# Altium integrated library WE_WR-MPC3_Micro Power Connector_3.00 mm_rev15c.IntLib: 173 symbols (part 1 of 2) (continued)
## WE-3.00 mm Micro Power Connector 66201111022
designator C?
WR-MPC3 3.00 mm Male Single Row Angled Header; Manufacturer: Würth Elektronik eiSos GmbH; ComponentLink1 Description: Manufacturer; ComponentLink2 Description: Datasheet; NoPins: 11; Created Date: 28 August 2013; partNo: 66201111022; ComponentLink1URL: http://www.we-online.com; ComponentLink2URL: http://katalog.we-online.de/em/datasheet/6620xx11022.pdf; Created by: Karrer Zheng
footprint 66201111022 (Single row Right angle header With plastic peg 11p)
pins: 1, 2, 3, 4, 5, 6, 7, 8, 9, 10, 11

## WE-3.00 mm Micro Power Connector 66201211022
designator C?
WR-MPC3 3.00 mm Male Single Row Angled Header; Manufacturer: Würth Elektronik eiSos GmbH; ComponentLink1 Description: Manufacturer; ComponentLink2 Description: Datasheet; NoPins: 12; Created Date: 28 August 2013; partNo: 66201211022; ComponentLink1URL: http://www.we-online.com; ComponentLink2URL: http://katalog.we-online.de/em/datasheet/6620xx11022.pdf; Created by: Karrer Zheng
footprint 66201211022 (Single row Right angle header With plastic peg 12p)
pins: 1, 2, 3, 4, 5, 6, 7, 8, 9, 10, 11, 12


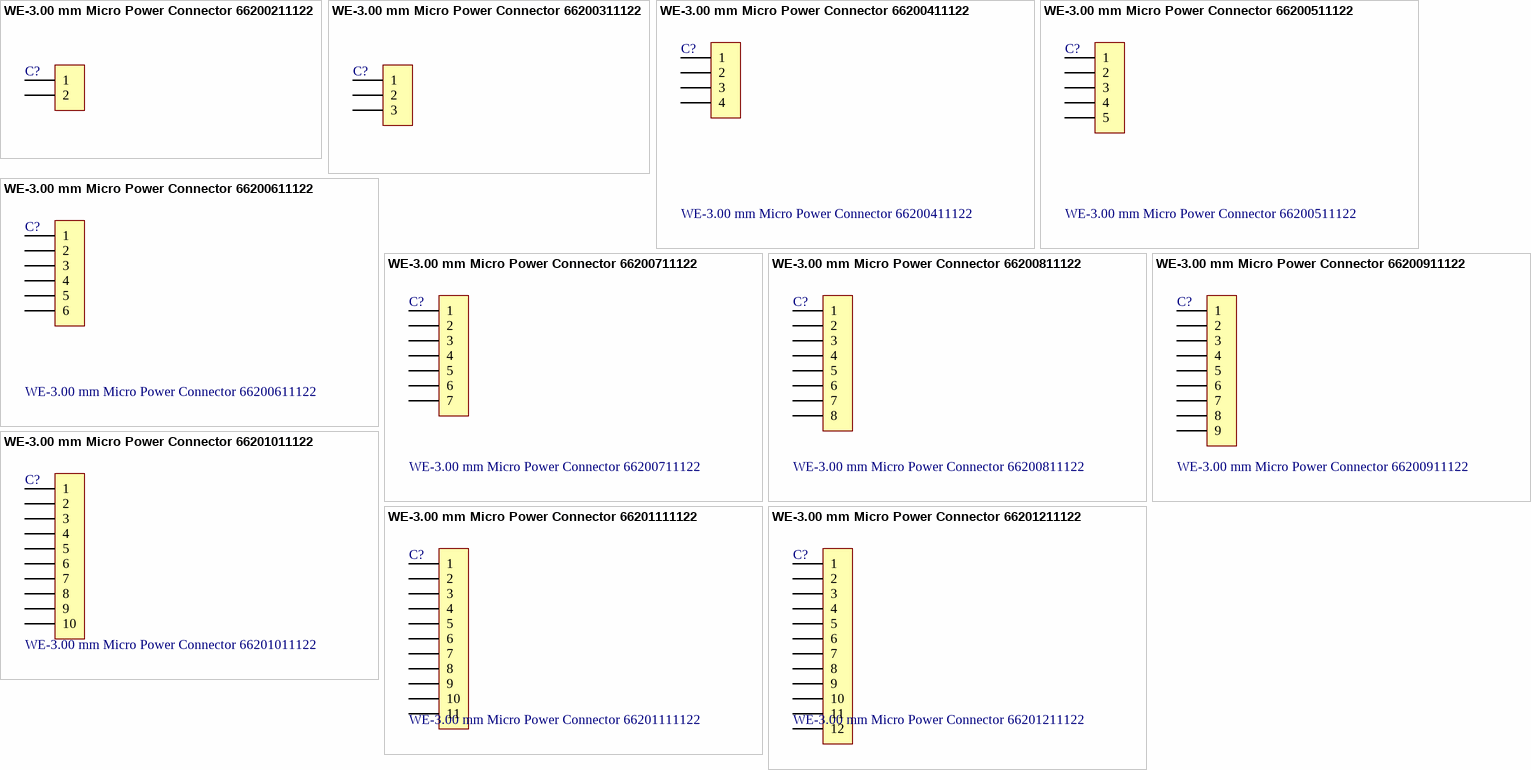
[diagram p8: symbols WE-3.00 mm Micro Power Connector 66200211122 to WE-3.00 mm Micro Power Connector 66201211122]

## WE-3.00 mm Micro Power Connector 66200211122
designator C?
WR-MPC3 3.00 mm Male Single Row Vertical Header; Manufacturer: Würth Elektronik eiSos GmbH; ComponentLink1 Description: Manufacturer; ComponentLink2 Description: Datasheet; NoPins: 02; Created Date: 27 August 2013; partNo: 66200211122; ComponentLink1URL: http://www.we-online.com; ComponentLink2URL: http://katalog.we-online.de/em/datasheet/6620xx11122.pdf; Created by: Karrer Zheng
footprint 66200211122 (Single row Vertical header 02p)
pins: 1, 2

## WE-3.00 mm Micro Power Connector 66200311122
designator C?
WR-MPC3 3.00 mm Male Single Row Vertical Header; Manufacturer: Würth Elektronik eiSos GmbH; ComponentLink1 Description: Manufacturer; ComponentLink2 Description: Datasheet; NoPins: 03; Created Date: 27 August 2013; partNo: 66200311122; ComponentLink1URL: http://www.we-online.com; ComponentLink2URL: http://katalog.we-online.de/em/datasheet/6620xx11122.pdf; Created by: Karrer Zheng
footprint 66200311122 (Single row Vertical header 03p)
pins: 1, 2, 3

## WE-3.00 mm Micro Power Connector 66200411122
designator C?
WR-MPC3 3.00 mm Male Single Row Vertical Header; Manufacturer: Würth Elektronik eiSos GmbH; ComponentLink1 Description: Manufacturer; ComponentLink2 Description: Datasheet; NoPins: 04; Created Date: 27 August 2013; partNo: 66200411122; ComponentLink1URL: http://www.we-online.com; ComponentLink2URL: http://katalog.we-online.de/em/datasheet/6620xx11122.pdf; Created by: Karrer Zheng
footprint 66200411122 (Single row Vertical header 04p)
pins: 1, 2, 3, 4

## WE-3.00 mm Micro Power Connector 66200511122
designator C?
WR-MPC3 3.00 mm Male Single Row Vertical Header; Manufacturer: Würth Elektronik eiSos GmbH; ComponentLink1 Description: Manufacturer; ComponentLink2 Description: Datasheet; NoPins: 05; Created Date: 27 August 2013; partNo: 66200511122; ComponentLink1URL: http://www.we-online.com; ComponentLink2URL: http://katalog.we-online.de/em/datasheet/6620xx11122.pdf; Created by: Karrer Zheng
footprint 66200511122 (Single row Vertical header 05p)
pins: 1, 2, 3, 4, 5

## WE-3.00 mm Micro Power Connector 66200611122
designator C?
WR-MPC3 3.00 mm Male Single Row Vertical Header; Manufacturer: Würth Elektronik eiSos GmbH; ComponentLink1 Description: Manufacturer; ComponentLink2 Description: Datasheet; NoPins: 06; Created Date: 27 August 2013; partNo: 66200611122; ComponentLink1URL: http://www.we-online.com; ComponentLink2URL: http://katalog.we-online.de/em/datasheet/6620xx11122.pdf; Created by: Karrer Zheng
footprint 66200611122 (Single row Vertical header 06p)
pins: 1, 2, 3, 4, 5, 6

## WE-3.00 mm Micro Power Connector 66200711122
designator C?
WR-MPC3 3.00 mm Male Single Row Vertical Header; Manufacturer: Würth Elektronik eiSos GmbH; ComponentLink1 Description: Manufacturer; ComponentLink2 Description: Datasheet; NoPins: 07; Created Date: 27 August 2013; partNo: 66200711122; ComponentLink1URL: http://www.we-online.com; ComponentLink2URL: http://katalog.we-online.de/em/datasheet/6620xx11122.pdf; Created by: Karrer Zheng
footprint 66200711122 (Single row Vertical header 07p)
pins: 1, 2, 3, 4, 5, 6, 7

## WE-3.00 mm Micro Power Connector 66200811122
designator C?
WR-MPC3 3.00 mm Male Single Row Vertical Header; Manufacturer: Würth Elektronik eiSos GmbH; ComponentLink1 Description: Manufacturer; ComponentLink2 Description: Datasheet; NoPins: 08; Created Date: 27 August 2013; partNo: 66200811122; ComponentLink1URL: http://www.we-online.com; ComponentLink2URL: http://katalog.we-online.de/em/datasheet/6620xx11122.pdf; Created by: Karrer Zheng
footprint 66200811122 (Single row Vertical header 08p)
pins: 1, 2, 3, 4, 5, 6, 7, 8

## WE-3.00 mm Micro Power Connector 66200911122
designator C?
WR-MPC3 3.00 mm Male Single Row Vertical Header; Manufacturer: Würth Elektronik eiSos GmbH; ComponentLink1 Description: Manufacturer; ComponentLink2 Description: Datasheet; NoPins: 09; Created Date: 27 August 2013; partNo: 66200911122; ComponentLink1URL: http://www.we-online.com; ComponentLink2URL: http://katalog.we-online.de/em/datasheet/6620xx11122.pdf; Created by: Karrer Zheng
footprint 66200911122 (Single row Vertical header 09p)
pins: 1, 2, 3, 4, 5, 6, 7, 8, 9

## WE-3.00 mm Micro Power Connector 66201011122
designator C?
WR-MPC3 3.00 mm Male Single Row Vertical Header; Manufacturer: Würth Elektronik eiSos GmbH; ComponentLink1 Description: Manufacturer; ComponentLink2 Description: Datasheet; NoPins: 10; Created Date: 27 August 2013; partNo: 66201011122; ComponentLink1URL: http://www.we-online.com; ComponentLink2URL: http://katalog.we-online.de/em/datasheet/6620xx11122.pdf; Created by: Karrer Zheng
footprint 66201011122 (Single row Vertical header 10p)
pins: 1, 2, 3, 4, 5, 6, 7, 8, 9, 10

## WE-3.00 mm Micro Power Connector 66201111122
designator C?
WR-MPC3 3.00 mm Male Single Row Vertical Header; Manufacturer: Würth Elektronik eiSos GmbH; ComponentLink1 Description: Manufacturer; ComponentLink2 Description: Datasheet; NoPins: 11; Created Date: 27 August 2013; partNo: 66201111122; ComponentLink1URL: http://www.we-online.com; ComponentLink2URL: http://katalog.we-online.de/em/datasheet/6620xx11122.pdf; Created by: Karrer Zheng
footprint 66201111122 (Single row Vertical header 11p)
pins: 1, 2, 3, 4, 5, 6, 7, 8, 9, 10, 11

## WE-3.00 mm Micro Power Connector 66201211122
designator C?
WR-MPC3 3.00 mm Male Single Row Vertical Header; Manufacturer: Würth Elektronik eiSos GmbH; ComponentLink1 Description: Manufacturer; ComponentLink2 Description: Datasheet; NoPins: 12; Created Date: 27 August 2013; partNo: 66201211122; ComponentLink1URL: http://www.we-online.com; ComponentLink2URL: http://katalog.we-online.de/em/datasheet/6620xx11122.pdf; Created by: Karrer Zheng
footprint 66201211122 (Single row Vertical header 12p)
pins: 1, 2, 3, 4, 5, 6, 7, 8, 9, 10, 11, 12


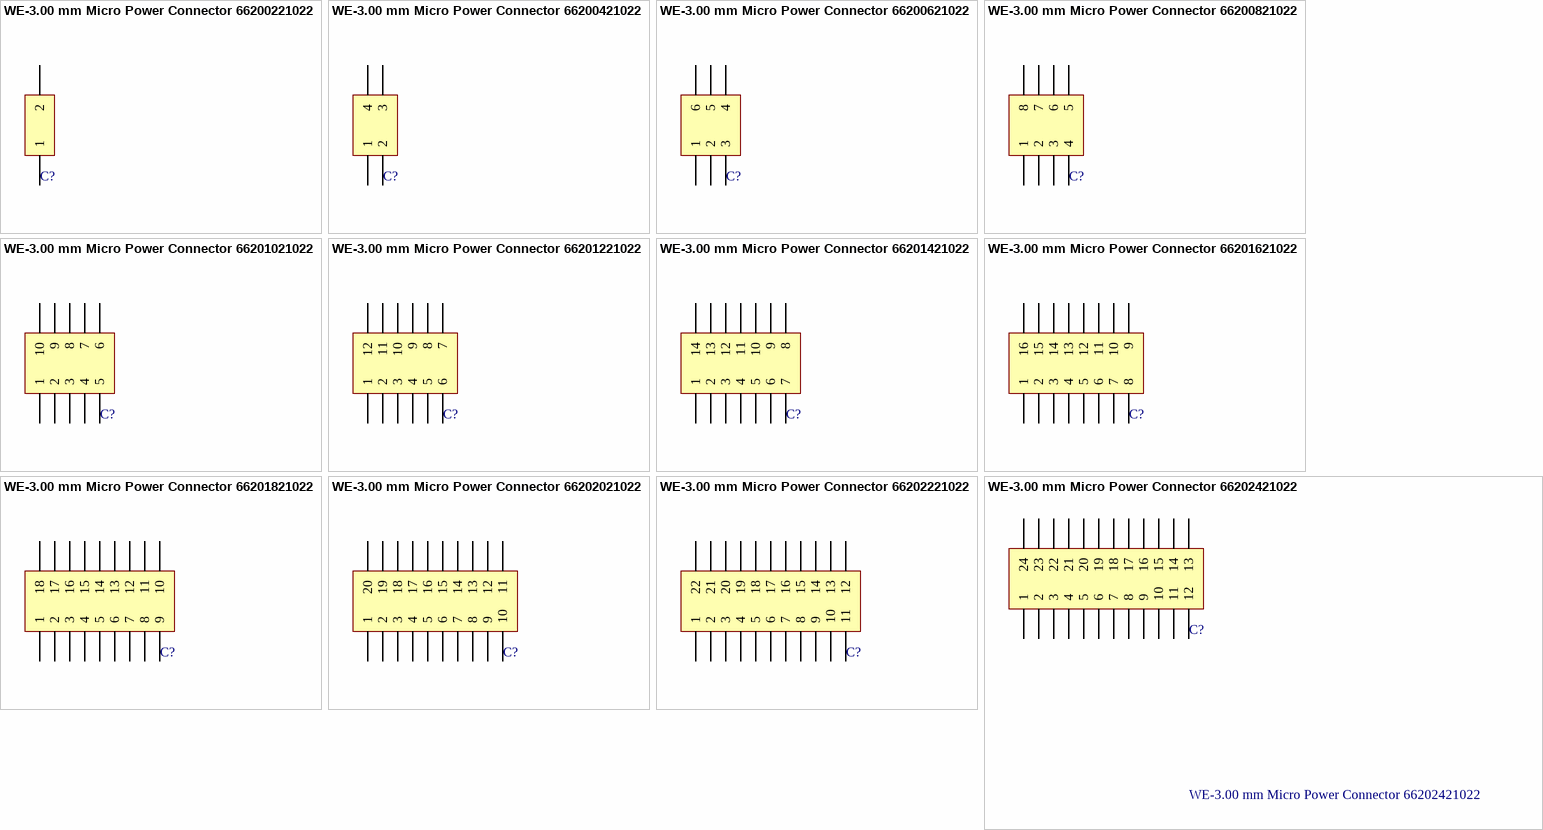
[diagram p9: symbols WE-3.00 mm Micro Power Connector 66200221022 to WE-3.00 mm Micro Power Connector 66202421022]

## WE-3.00 mm Micro Power Connector 66200221022
designator C?
WR-MPC3 3.00 mm Male Dual Row Angled Header with Plastic Pegs; Manufacturer: Würth Elektronik eiSos GmbH; ComponentLink1 Description: Manufacturer; ComponentLink2 Description: Datasheet; NoPins: 02; Created Date: 20 August 2013; partNo: 66200221022; ComponentLink1URL: http://www.we-online.com; ComponentLink2URL: http://katalog.we-online.de/em/datasheet/6620xx21022.pdf; Created by: Karrer Zheng
footprint 66200221022 (Dual row Right angle header With plastic peg 02p)
pins: 1, 2

## WE-3.00 mm Micro Power Connector 66200421022
designator C?
WR-MPC3 3.00 mm Male Dual Row Angled Header with Plastic Pegs; Manufacturer: Würth Elektronik eiSos GmbH; ComponentLink1 Description: Manufacturer; ComponentLink2 Description: Datasheet; NoPins: 04; Created Date: 20 August 2013; partNo: 66200421022; ComponentLink1URL: http://www.we-online.com; ComponentLink2URL: http://katalog.we-online.de/em/datasheet/6620xx21022.pdf; Created by: Karrer Zheng
footprint 66200421022 (Dual row Right angle header With plastic peg 04p)
pins: 1, 2, 3, 4

## WE-3.00 mm Micro Power Connector 66200621022
designator C?
WR-MPC3 3.00 mm Male Dual Row Angled Header with Plastic Pegs; Manufacturer: Würth Elektronik eiSos GmbH; ComponentLink1 Description: Manufacturer; ComponentLink2 Description: Datasheet; NoPins: 06; Created Date: 20 August 2013; partNo: 66200621022; ComponentLink1URL: http://www.we-online.com; ComponentLink2URL: http://katalog.we-online.de/em/datasheet/6620xx21022.pdf; Created by: Karrer Zheng
footprint 66200621022 (Dual row Right angle header With plastic peg 06p)
pins: 1, 2, 3, 4, 5, 6

## WE-3.00 mm Micro Power Connector 66200821022
designator C?
WR-MPC3 3.00 mm Male Dual Row Angled Header with Plastic Pegs; Manufacturer: Würth Elektronik eiSos GmbH; ComponentLink1 Description: Manufacturer; ComponentLink2 Description: Datasheet; NoPins: 08; Created Date: 20 August 2013; partNo: 66200821022; ComponentLink1URL: http://www.we-online.com; ComponentLink2URL: http://katalog.we-online.de/em/datasheet/6620xx21022.pdf; Created by: Karrer Zheng
footprint 66200821022 (Dual row Right angle header With plastic peg 08p)
pins: 1, 2, 3, 4, 5, 6, 7, 8

## WE-3.00 mm Micro Power Connector 66201021022
designator C?
WR-MPC3 3.00 mm Male Dual Row Angled Header with Plastic Pegs; Manufacturer: Würth Elektronik eiSos GmbH; ComponentLink1 Description: Manufacturer; ComponentLink2 Description: Datasheet; NoPins: 10; Created Date: 20 August 2013; partNo: 66201021022; ComponentLink1URL: http://www.we-online.com; ComponentLink2URL: http://katalog.we-online.de/em/datasheet/6620xx21022.pdf; Created by: Karrer Zheng
footprint 66201021022 (Dual row Right angle header With plastic peg 10p)
pins: 1, 2, 3, 4, 5, 6, 7, 8, 9, 10

## WE-3.00 mm Micro Power Connector 66201221022
designator C?
WR-MPC3 3.00 mm Male Dual Row Angled Header with Plastic Pegs; Manufacturer: Würth Elektronik eiSos GmbH; ComponentLink1 Description: Manufacturer; ComponentLink2 Description: Datasheet; NoPins: 12; Created Date: 20 August 2013; partNo: 66201221022; ComponentLink1URL: http://www.we-online.com; ComponentLink2URL: http://katalog.we-online.de/em/datasheet/6620xx21022.pdf; Created by: Karrer Zheng
footprint 66201221022 (Dual row Right angle header With plastic peg 12p)
pins: 1, 2, 3, 4, 5, 6, 7, 8, 9, 10, 11, 12

## WE-3.00 mm Micro Power Connector 66201421022
designator C?
WR-MPC3 3.00 mm Male Dual Row Angled Header with Plastic Pegs; Manufacturer: Würth Elektronik eiSos GmbH; ComponentLink1 Description: Manufacturer; ComponentLink2 Description: Datasheet; NoPins: 14; Created Date: 20 August 2013; partNo: 66201421022; ComponentLink1URL: http://www.we-online.com; ComponentLink2URL: http://katalog.we-online.de/em/datasheet/6620xx21022.pdf; Created by: Karrer Zheng
footprint 66201421022 (Dual row Right angle header With plastic peg 14p)
pins: 1, 2, 3, 4, 5, 6, 7, 8, 9, 10, 11, 12, 13, 14

## WE-3.00 mm Micro Power Connector 66201621022
designator C?
WR-MPC3 3.00 mm Male Dual Row Angled Header with Plastic Pegs; Manufacturer: Würth Elektronik eiSos GmbH; ComponentLink1 Description: Manufacturer; ComponentLink2 Description: Datasheet; NoPins: 16; Created Date: 20 August 2013; partNo: 66201621022; ComponentLink1URL: http://www.we-online.com; ComponentLink2URL: http://katalog.we-online.de/em/datasheet/6620xx21022.pdf; Created by: Karrer Zheng
footprint 66201621022 (Dual row Right angle header With plastic peg 16p)
pins: 1, 2, 3, 4, 5, 6, 7, 8, 9, 10, 11, 12, 13, 14, 15, 16

## WE-3.00 mm Micro Power Connector 66201821022
designator C?
WR-MPC3 3.00 mm Male Dual Row Angled Header with Plastic Pegs; Manufacturer: Würth Elektronik eiSos GmbH; ComponentLink1 Description: Manufacturer; ComponentLink2 Description: Datasheet; NoPins: 18; Created Date: 20 August 2013; partNo: 66201821022; ComponentLink1URL: http://www.we-online.com; ComponentLink2URL: http://katalog.we-online.de/em/datasheet/6620xx21022.pdf; Created by: Karrer Zheng
footprint 66201821022 (Dual row Right angle header With plastic peg 18p)
pins: 1, 2, 3, 4, 5, 6, 7, 8, 9, 10, 11, 12, 13, 14, 15, 16, 17, 18

## WE-3.00 mm Micro Power Connector 66202021022
designator C?
WR-MPC3 3.00 mm Male Dual Row Angled Header with Plastic Pegs; Manufacturer: Würth Elektronik eiSos GmbH; ComponentLink1 Description: Manufacturer; ComponentLink2 Description: Datasheet; NoPins: 20; Created Date: 20 August 2013; partNo: 66202021022; ComponentLink1URL: http://www.we-online.com; ComponentLink2URL: http://katalog.we-online.de/em/datasheet/6620xx21022.pdf; Created by: Karrer Zheng
footprint 66202021022 (Dual row Right angle header With plastic peg 20p)
pins: 1, 2, 3, 4, 5, 6, 7, 8, 9, 10, 11, 12, 13, 14, 15, 16, 17, 18, 19, 20

## WE-3.00 mm Micro Power Connector 66202221022
designator C?
WR-MPC3 3.00 mm Male Dual Row Angled Header with Plastic Pegs; Manufacturer: Würth Elektronik eiSos GmbH; ComponentLink1 Description: Manufacturer; ComponentLink2 Description: Datasheet; NoPins: 22; Created Date: 20 August 2013; partNo: 66202221022; ComponentLink1URL: http://www.we-online.com; ComponentLink2URL: http://katalog.we-online.de/em/datasheet/6620xx21022.pdf; Created by: Karrer Zheng
footprint 66202221022 (Dual row Right angle header With plastic peg 22p)
pins: 1, 2, 3, 4, 5, 6, 7, 8, 9, 10, 11, 12, 13, 14, 15, 16, 17, 18, 19, 20, 21, 22

## WE-3.00 mm Micro Power Connector 66202421022
designator C?
WR-MPC3 3.00 mm Male Dual Row Angled Header with Plastic Pegs; Manufacturer: Würth Elektronik eiSos GmbH; ComponentLink1 Description: Manufacturer; ComponentLink2 Description: Datasheet; NoPins: 24; Created Date: 20 August 2013; partNo: 66202421022; ComponentLink1URL: http://www.we-online.com; ComponentLink2URL: http://katalog.we-online.de/em/datasheet/6620xx21022.pdf; Created by: Karrer Zheng
footprint 66202421022 (Dual row Right angle header With plastic peg 24p)
pins: 1, 2, 3, 4, 5, 6, 7, 8, 9, 10, 11, 12, 13, 14, 15, 16, 17, 18, 19, 20, 21, 22, 23, 24


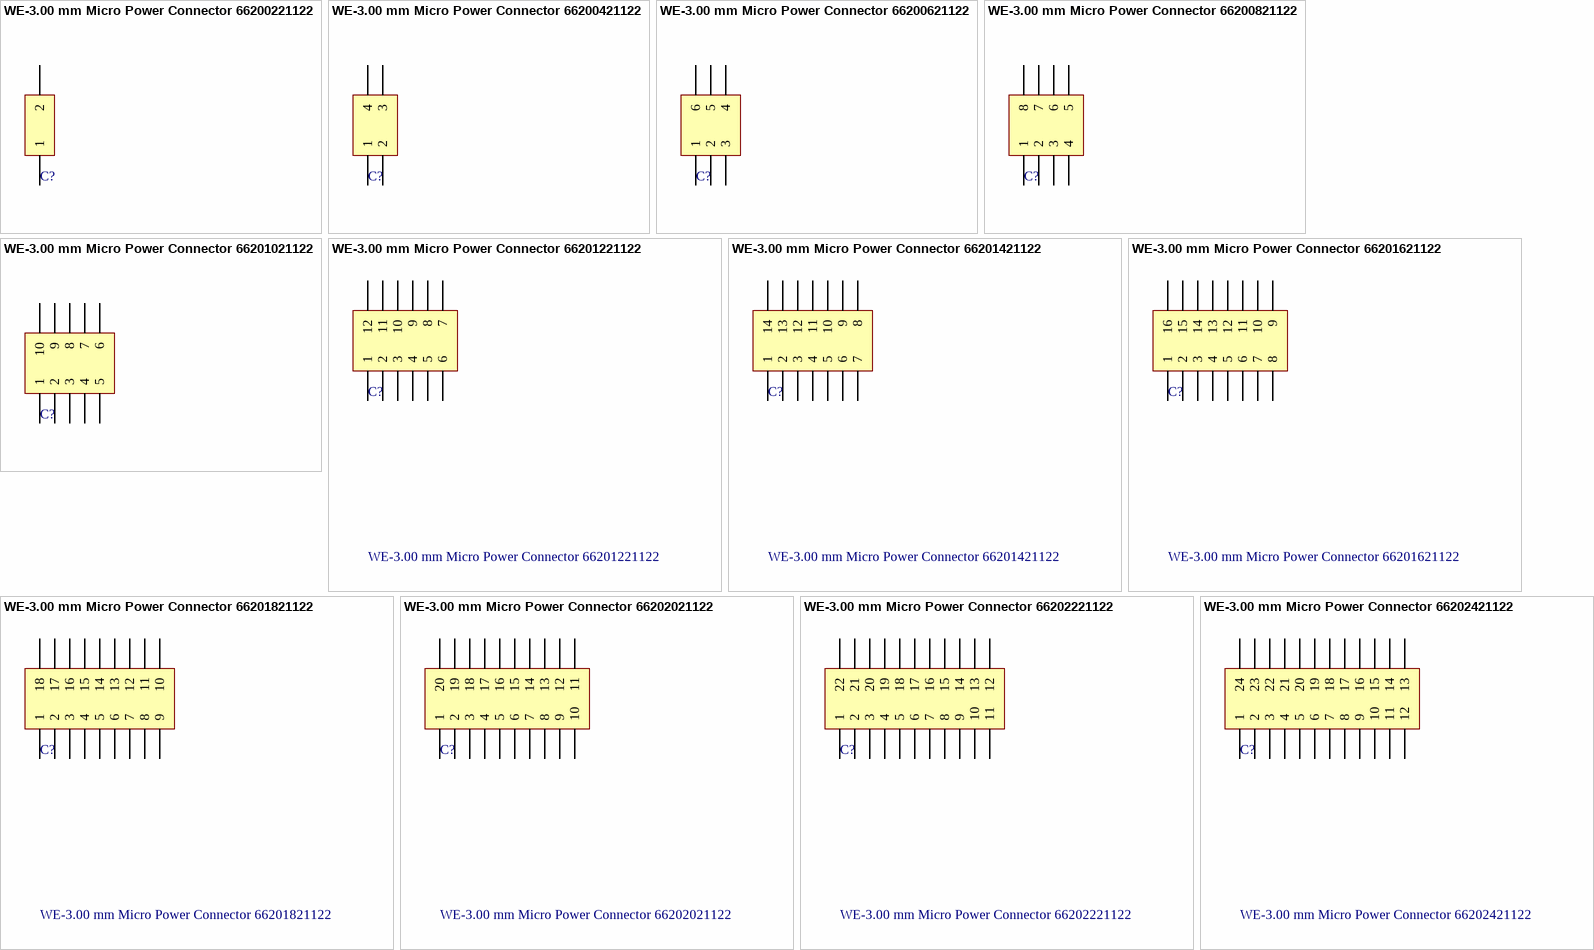
[diagram p10: symbols WE-3.00 mm Micro Power Connector 66200221122 to WE-3.00 mm Micro Power Connector 66202421122]

## WE-3.00 mm Micro Power Connector 66200221122
designator C?
WR-MPC3 3.00 mm Male Dual Row Vertical Header; Manufacturer: Würth Elektronik eiSos GmbH; ComponentLink1 Description: Manufacturer; ComponentLink2 Description: Datasheet; NoPins: 02; Created Date: 30 July 2013; partNo: 66200221122; ComponentLink1URL: http://www.we-online.com; ComponentLink2URL: http://katalog.we-online.de/em/datasheet/6620xx21122.pdf; Created by: Karrer Zheng
footprint 66200221122 (Dual row Vertical header 02p)
pins: 1, 2

## WE-3.00 mm Micro Power Connector 66200421122
designator C?
WR-MPC3 3.00 mm Male Dual Row Vertical Header; Manufacturer: Würth Elektronik eiSos GmbH; ComponentLink1 Description: Manufacturer; ComponentLink2 Description: Datasheet; NoPins: 04; Created Date: 30 July 2013; partNo: 66200421122; ComponentLink1URL: http://www.we-online.com; ComponentLink2URL: http://katalog.we-online.de/em/datasheet/6620xx21122.pdf; Created by: Karrer Zheng
footprint 66200421122 (Dual row Vertical header 04p)
pins: 1, 2, 3, 4

## WE-3.00 mm Micro Power Connector 66200621122
designator C?
WR-MPC3 3.00 mm Male Dual Row Vertical Header; Manufacturer: Würth Elektronik eiSos GmbH; ComponentLink1 Description: Manufacturer; ComponentLink2 Description: Datasheet; NoPins: 06; Created Date: 30 July 2013; partNo: 66200621122; ComponentLink1URL: http://www.we-online.com; ComponentLink2URL: http://katalog.we-online.de/em/datasheet/6620xx21122.pdf; Created by: Karrer Zheng
footprint 66200621122 (Dual row Vertical header 06p)
pins: 1, 2, 3, 4, 5, 6

## WE-3.00 mm Micro Power Connector 66200821122
designator C?
WR-MPC3 3.00 mm Male Dual Row Vertical Header; Manufacturer: Würth Elektronik eiSos GmbH; ComponentLink1 Description: Manufacturer; ComponentLink2 Description: Datasheet; NoPins: 08; Created Date: 30 July 2013; partNo: 66200821122; ComponentLink1URL: http://www.we-online.com; ComponentLink2URL: http://katalog.we-online.de/em/datasheet/6620xx21122.pdf; Created by: Karrer Zheng
footprint 66200821122 (Dual row Vertical header 08p)
pins: 1, 2, 3, 4, 5, 6, 7, 8

## WE-3.00 mm Micro Power Connector 66201021122
designator C?
WR-MPC3 3.00 mm Male Dual Row Vertical Header; Manufacturer: Würth Elektronik eiSos GmbH; ComponentLink1 Description: Manufacturer; ComponentLink2 Description: Datasheet; NoPins: 10; Created Date: 30 July 2013; partNo: 66201021122; ComponentLink1URL: http://www.we-online.com; ComponentLink2URL: http://katalog.we-online.de/em/datasheet/6620xx21122.pdf; Created by: Karrer Zheng
footprint 66201021122 (Dual row Vertical header 10p)
pins: 1, 2, 3, 4, 5, 6, 7, 8, 9, 10

## WE-3.00 mm Micro Power Connector 66201221122
designator C?
WR-MPC3 3.00 mm Male Dual Row Vertical Header; Manufacturer: Würth Elektronik eiSos GmbH; ComponentLink1 Description: Manufacturer; ComponentLink2 Description: Datasheet; NoPins: 12; Created Date: 30 July 2013; partNo: 66201221122; ComponentLink1URL: http://www.we-online.com; ComponentLink2URL: http://katalog.we-online.de/em/datasheet/6620xx21122.pdf; Created by: Karrer Zheng
footprint 66201221122 (Dual row Vertical header 12p)
pins: 1, 2, 3, 4, 5, 6, 7, 8, 9, 10, 11, 12

## WE-3.00 mm Micro Power Connector 66201421122
designator C?
WR-MPC3 3.00 mm Male Dual Row Vertical Header; Manufacturer: Würth Elektronik eiSos GmbH; ComponentLink1 Description: Manufacturer; ComponentLink2 Description: Datasheet; NoPins: 14; Created Date: 30 July 2013; partNo: 66201421122; ComponentLink1URL: http://www.we-online.com; ComponentLink2URL: http://katalog.we-online.de/em/datasheet/6620xx21122.pdf; Created by: Karrer Zheng
footprint 66201421122 (Dual row Vertical header 14p)
pins: 1, 2, 3, 4, 5, 6, 7, 8, 9, 10, 11, 12, 13, 14

## WE-3.00 mm Micro Power Connector 66201621122
designator C?
WR-MPC3 3.00 mm Male Dual Row Vertical Header; Manufacturer: Würth Elektronik eiSos GmbH; ComponentLink1 Description: Manufacturer; ComponentLink2 Description: Datasheet; NoPins: 16; Created Date: 30 July 2013; partNo: 66201621122; ComponentLink1URL: http://www.we-online.com; ComponentLink2URL: http://katalog.we-online.de/em/datasheet/6620xx21122.pdf; Created by: Karrer Zheng
footprint 66201621122 (Dual row Vertical header 16p)
pins: 1, 2, 3, 4, 5, 6, 7, 8, 9, 10, 11, 12, 13, 14, 15, 16

## WE-3.00 mm Micro Power Connector 66201821122
designator C?
WR-MPC3 3.00 mm Male Dual Row Vertical Header; Manufacturer: Würth Elektronik eiSos GmbH; ComponentLink1 Description: Manufacturer; ComponentLink2 Description: Datasheet; NoPins: 18; Created Date: 30 July 2013; partNo: 66201821122; ComponentLink1URL: http://www.we-online.com; ComponentLink2URL: http://katalog.we-online.de/em/datasheet/6620xx21122.pdf; Created by: Karrer Zheng
footprint 66201821122 (Dual row Vertical header 18p)
pins: 1, 2, 3, 4, 5, 6, 7, 8, 9, 10, 11, 12, 13, 14, 15, 16, 17, 18

## WE-3.00 mm Micro Power Connector 66202021122
designator C?
WR-MPC3 3.00 mm Male Dual Row Vertical Header; Manufacturer: Würth Elektronik eiSos GmbH; ComponentLink1 Description: Manufacturer; ComponentLink2 Description: Datasheet; NoPins: 20; Created Date: 30 July 2013; partNo: 66202021122; ComponentLink1URL: http://www.we-online.com; ComponentLink2URL: http://katalog.we-online.de/em/datasheet/6620xx21122.pdf; Created by: Karrer Zheng
footprint 66202021122 (Dual row Vertical header 20p)
pins: 1, 2, 3, 4, 5, 6, 7, 8, 9, 10, 11, 12, 13, 14, 15, 16, 17, 18, 19, 20

## WE-3.00 mm Micro Power Connector 66202221122
designator C?
WR-MPC3 3.00 mm Male Dual Row Vertical Header; Manufacturer: Würth Elektronik eiSos GmbH; ComponentLink1 Description: Manufacturer; ComponentLink2 Description: Datasheet; NoPins: 22; Created Date: 30 July 2013; partNo: 66202221122; ComponentLink1URL: http://www.we-online.com; ComponentLink2URL: http://katalog.we-online.de/em/datasheet/6620xx21122.pdf; Created by: Karrer Zheng
footprint 66202221122 (Dual row Vertical header 22p)
pins: 1, 2, 3, 4, 5, 6, 7, 8, 9, 10, 11, 12, 13, 14, 15, 16, 17, 18, 19, 20, 21, 22

## WE-3.00 mm Micro Power Connector 66202421122
designator C?
WR-MPC3 3.00 mm Male Dual Row Vertical Header; Manufacturer: Würth Elektronik eiSos GmbH; ComponentLink1 Description: Manufacturer; ComponentLink2 Description: Datasheet; NoPins: 24; Created Date: 30 July 2013; partNo: 66202421122; ComponentLink1URL: http://www.we-online.com; ComponentLink2URL: http://katalog.we-online.de/em/datasheet/6620xx21122.pdf; Created by: Karrer Zheng
footprint 66202421122 (Dual row Vertical header 26p)
pins: 1, 2, 3, 4, 5, 6, 7, 8, 9, 10, 11, 12, 13, 14, 15, 16, 17, 18, 19, 20, 21, 22, 23, 24


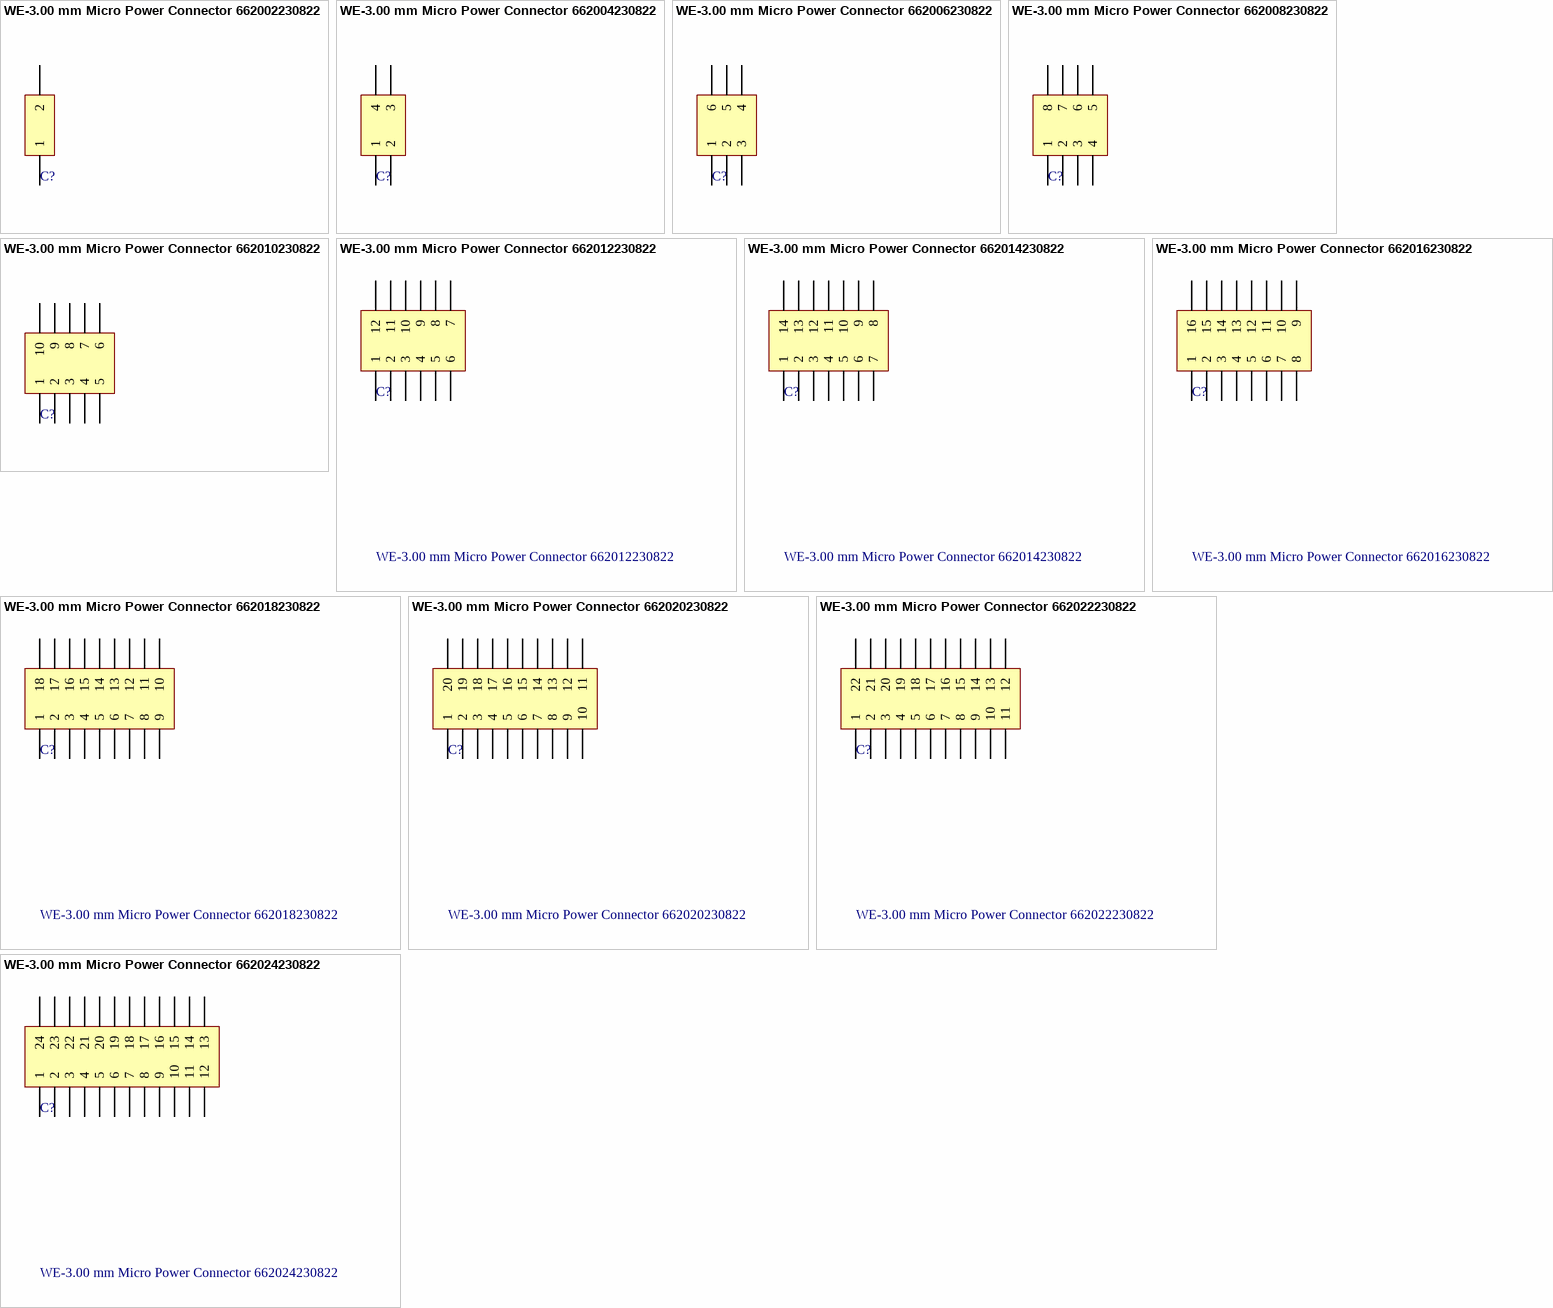
[diagram p11: symbols WE-3.00 mm Micro Power Connector 662002230822 to WE-3.00 mm Micro Power Connector 662024230822]

## WE-3.00 mm Micro Power Connector 662002230822
designator C?
WR-MPC3 3.00 mm Male Dual Row SMT Angled Header Through Hole Retention Clip; Manufacturer: Würth Elektronik eiSos GmbH; ComponentLink1 Description: Manufacturer; ComponentLink2 Description: Datasheet; NoPins: 02; Created Date: 22 August 2013; partNo: 662002230822; ComponentLink1URL: http://www.we-online.com; ComponentLink2URL: http://katalog.we-online.de/em/datasheet/6620xx230822.pdf; Created by: Karrer Zheng
footprint 662002230822 (Dual row SMT Right angle header With TH Metal Clip 02p)
pins: 1, 2

## WE-3.00 mm Micro Power Connector 662004230822
designator C?
WR-MPC3 3.00 mm Male Dual Row SMT Angled Header Through Hole Retention Clip; Manufacturer: Würth Elektronik eiSos GmbH; ComponentLink1 Description: Manufacturer; ComponentLink2 Description: Datasheet; NoPins: 04; Created Date: 22 August 2013; partNo: 662004230822; ComponentLink1URL: http://www.we-online.com; ComponentLink2URL: http://katalog.we-online.de/em/datasheet/6620xx230822.pdf; Created by: Karrer Zheng
footprint 662004230822 (Dual row SMT Right angle header With TH Metal Clip 04p)
pins: 1, 2, 3, 4

## WE-3.00 mm Micro Power Connector 662006230822
designator C?
WR-MPC3 3.00 mm Male Dual Row SMT Angled Header Through Hole Retention Clip; Manufacturer: Würth Elektronik eiSos GmbH; ComponentLink1 Description: Manufacturer; ComponentLink2 Description: Datasheet; NoPins: 06; Created Date: 22 August 2013; partNo: 662006230822; ComponentLink1URL: http://www.we-online.com; ComponentLink2URL: http://katalog.we-online.de/em/datasheet/6620xx230822.pdf; Created by: Karrer Zheng
footprint 662006230822 (Dual row SMT Right angle header With TH Metal Clip 06p)
pins: 1, 2, 3, 4, 5, 6

## WE-3.00 mm Micro Power Connector 662008230822
designator C?
WR-MPC3 3.00 mm Male Dual Row SMT Angled Header Through Hole Retention Clip; Manufacturer: Würth Elektronik eiSos GmbH; ComponentLink1 Description: Manufacturer; ComponentLink2 Description: Datasheet; NoPins: 08; Created Date: 22 August 2013; partNo: 662008230822; ComponentLink1URL: http://www.we-online.com; ComponentLink2URL: http://katalog.we-online.de/em/datasheet/6620xx230822.pdf; Created by: Karrer Zheng
footprint 662008230822 (Dual row SMT Right angle header With TH Metal Clip 08p)
pins: 1, 2, 3, 4, 5, 6, 7, 8

## WE-3.00 mm Micro Power Connector 662010230822
designator C?
WR-MPC3 3.00 mm Male Dual Row SMT Angled Header Through Hole Retention Clip; Manufacturer: Würth Elektronik eiSos GmbH; ComponentLink1 Description: Manufacturer; ComponentLink2 Description: Datasheet; NoPins: 10; Created Date: 22 August 2013; partNo: 662010230822; ComponentLink1URL: http://www.we-online.com; ComponentLink2URL: http://katalog.we-online.de/em/datasheet/6620xx230822.pdf; Created by: Karrer Zheng
footprint 662010230822 (Dual row SMT Right angle header With TH Metal Clip 10p)
pins: 1, 2, 3, 4, 5, 6, 7, 8, 9, 10

## WE-3.00 mm Micro Power Connector 662012230822
designator C?
WR-MPC3 3.00 mm Male Dual Row SMT Angled Header Through Hole Retention Clip; Manufacturer: Würth Elektronik eiSos GmbH; ComponentLink1 Description: Manufacturer; ComponentLink2 Description: Datasheet; NoPins: 12; Created Date: 22 August 2013; partNo: 662012230822; ComponentLink1URL: http://www.we-online.com; ComponentLink2URL: http://katalog.we-online.de/em/datasheet/6620xx230822.pdf; Created by: Karrer Zheng
footprint 662012230822 (Dual row SMT Right angle header With TH Metal Clip 12p)
pins: 1, 2, 3, 4, 5, 6, 7, 8, 9, 10, 11, 12

## WE-3.00 mm Micro Power Connector 662014230822
designator C?
WR-MPC3 3.00 mm Male Dual Row SMT Angled Header Through Hole Retention Clip; Manufacturer: Würth Elektronik eiSos GmbH; ComponentLink1 Description: Manufacturer; ComponentLink2 Description: Datasheet; NoPins: 14; Created Date: 22 August 2013; partNo: 662014230822; ComponentLink1URL: http://www.we-online.com; ComponentLink2URL: http://katalog.we-online.de/em/datasheet/6620xx230822.pdf; Created by: Karrer Zheng
footprint 662014230822 (Dual row SMT Right angle header With TH Metal Clip 14p)
pins: 1, 2, 3, 4, 5, 6, 7, 8, 9, 10, 11, 12, 13, 14

## WE-3.00 mm Micro Power Connector 662016230822
designator C?
WR-MPC3 3.00 mm Male Dual Row SMT Angled Header Through Hole Retention Clip; Manufacturer: Würth Elektronik eiSos GmbH; ComponentLink1 Description: Manufacturer; ComponentLink2 Description: Datasheet; NoPins: 16; Created Date: 22 August 2013; partNo: 662016230822; ComponentLink1URL: http://www.we-online.com; ComponentLink2URL: http://katalog.we-online.de/em/datasheet/6620xx230822.pdf; Created by: Karrer Zheng
footprint 662016230822 (Dual row SMT Right angle header With TH Metal Clip 16p)
pins: 1, 2, 3, 4, 5, 6, 7, 8, 9, 10, 11, 12, 13, 14, 15, 16

## WE-3.00 mm Micro Power Connector 662018230822
designator C?
WR-MPC3 3.00 mm Male Dual Row SMT Angled Header Through Hole Retention Clip; Manufacturer: Würth Elektronik eiSos GmbH; ComponentLink1 Description: Manufacturer; ComponentLink2 Description: Datasheet; NoPins: 18; Created Date: 22 August 2013; partNo: 662018230822; ComponentLink1URL: http://www.we-online.com; ComponentLink2URL: http://katalog.we-online.de/em/datasheet/6620xx230822.pdf; Created by: Karrer Zheng
footprint 662018230822 (Dual row SMT Right angle header With TH Metal Clip 18p)
pins: 1, 2, 3, 4, 5, 6, 7, 8, 9, 10, 11, 12, 13, 14, 15, 16, 17, 18

## WE-3.00 mm Micro Power Connector 662020230822
designator C?
WR-MPC3 3.00 mm Male Dual Row SMT Angled Header Through Hole Retention Clip; Manufacturer: Würth Elektronik eiSos GmbH; ComponentLink1 Description: Manufacturer; ComponentLink2 Description: Datasheet; NoPins: 20; Created Date: 22 August 2013; partNo: 662020230822; ComponentLink1URL: http://www.we-online.com; ComponentLink2URL: http://katalog.we-online.de/em/datasheet/6620xx230822.pdf; Created by: Karrer Zheng
footprint 662020230822 (Dual row SMT Right angle header With TH Metal Clip 20p)
pins: 1, 2, 3, 4, 5, 6, 7, 8, 9, 10, 11, 12, 13, 14, 15, 16, 17, 18, 19, 20

## WE-3.00 mm Micro Power Connector 662022230822
designator C?
WR-MPC3 3.00 mm Male Dual Row SMT Angled Header Through Hole Retention Clip; Manufacturer: Würth Elektronik eiSos GmbH; ComponentLink1 Description: Manufacturer; ComponentLink2 Description: Datasheet; NoPins: 22; Created Date: 22 August 2013; partNo: 662022230822; ComponentLink1URL: http://www.we-online.com; ComponentLink2URL: http://katalog.we-online.de/em/datasheet/6620xx230822.pdf; Created by: Karrer Zheng
footprint 662022230822 (Dual row SMT Right angle header With TH Metal Clip 22p)
pins: 1, 2, 3, 4, 5, 6, 7, 8, 9, 10, 11, 12, 13, 14, 15, 16, 17, 18, 19, 20, 21, 22

## WE-3.00 mm Micro Power Connector 662024230822
designator C?
WR-MPC3 3.00 mm Male Dual Row SMT Angled Header Through Hole Retention Clip; Manufacturer: Würth Elektronik eiSos GmbH; ComponentLink1 Description: Manufacturer; ComponentLink2 Description: Datasheet; NoPins: 24; Created Date: 22 August 2013; partNo: 662024230822; ComponentLink1URL: http://www.we-online.com; ComponentLink2URL: http://katalog.we-online.de/em/datasheet/6620xx230822.pdf; Created by: Karrer Zheng
footprint 662024230822 (Dual row SMT Right angle header With TH Metal Clip 24p)
pins: 1, 2, 3, 4, 5, 6, 7, 8, 9, 10, 11, 12, 13, 14, 15, 16, 17, 18, 19, 20, 21, 22, 23, 24


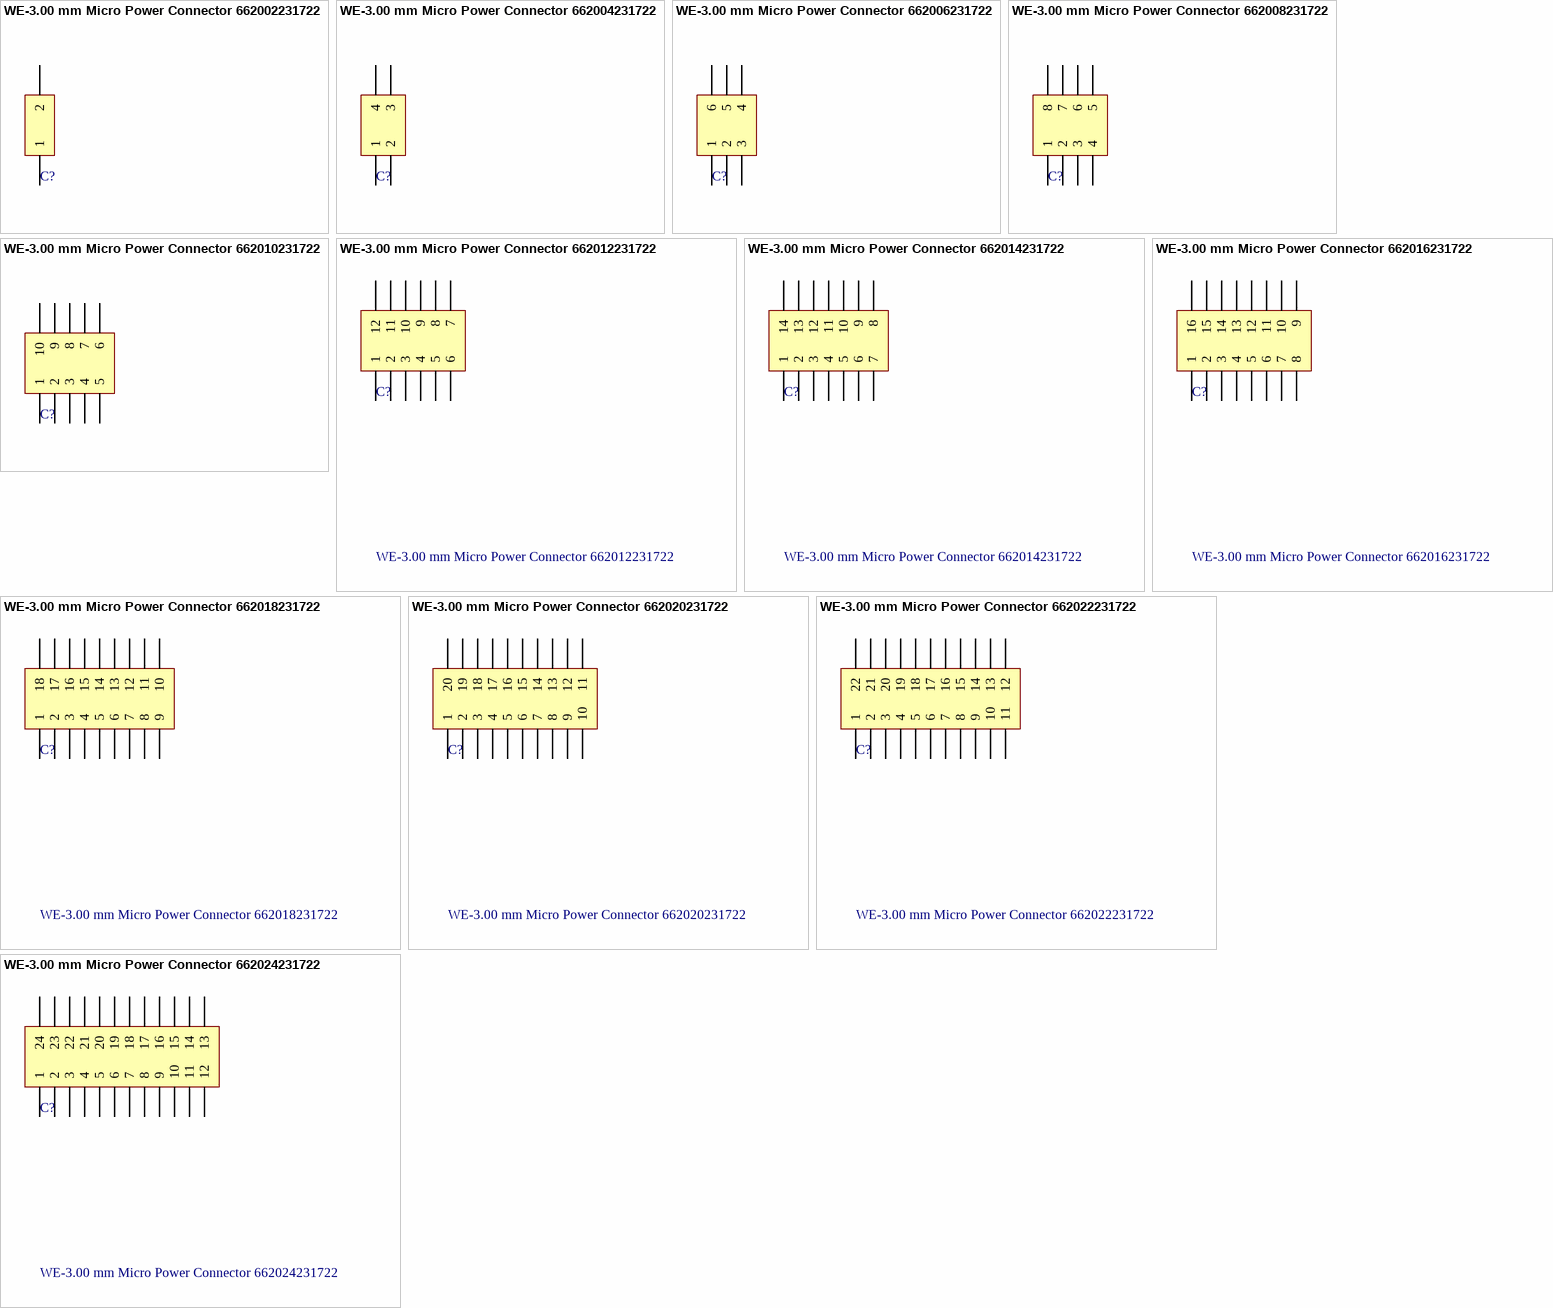
[diagram p12: symbols WE-3.00 mm Micro Power Connector 662002231722 to WE-3.00 mm Micro Power Connector 662024231722]

## WE-3.00 mm Micro Power Connector 662002231722
designator C?
WR-MPC3 3.00 mm Male Dual Row SMT Angled Header with Solder Tab Clip; Manufacturer: Würth Elektronik eiSos GmbH; ComponentLink1 Description: Manufacturer; ComponentLink2 Description: Datasheet; NoPins: 02; Created Date: 23 August 2013; partNo: 662002231722; ComponentLink1URL: http://www.we-online.com; ComponentLink2URL: http://katalog.we-online.de/em/datasheet/6620xx231722.pdf; Created by: Karrer Zheng
footprint 662002231722 (Dual row SMT Right angle header With SMT Solder Tab 02p)
pins: 1, 2

## WE-3.00 mm Micro Power Connector 662004231722
designator C?
WR-MPC3 3.00 mm Male Dual Row SMT Angled Header with Solder Tab Clip; Manufacturer: Würth Elektronik eiSos GmbH; ComponentLink1 Description: Manufacturer; ComponentLink2 Description: Datasheet; NoPins: 04; Created Date: 23 August 2013; partNo: 662004231722; ComponentLink1URL: http://www.we-online.com; ComponentLink2URL: http://katalog.we-online.de/em/datasheet/6620xx231722.pdf; Created by: Karrer Zheng
footprint 662004231722 (Dual row SMT Right angle header With SMT Solder Tab 04p)
pins: 1, 2, 3, 4

## WE-3.00 mm Micro Power Connector 662006231722
designator C?
WR-MPC3 3.00 mm Male Dual Row SMT Angled Header with Solder Tab Clip; Manufacturer: Würth Elektronik eiSos GmbH; ComponentLink1 Description: Manufacturer; ComponentLink2 Description: Datasheet; NoPins: 06; Created Date: 23 August 2013; partNo: 662006231722; ComponentLink1URL: http://www.we-online.com; ComponentLink2URL: http://katalog.we-online.de/em/datasheet/6620xx231722.pdf; Created by: Karrer Zheng
footprint 662006231722 (Dual row SMT Right angle header With SMT Solder Tab 06p)
pins: 1, 2, 3, 4, 5, 6

## WE-3.00 mm Micro Power Connector 662008231722
designator C?
WR-MPC3 3.00 mm Male Dual Row SMT Angled Header with Solder Tab Clip; Manufacturer: Würth Elektronik eiSos GmbH; ComponentLink1 Description: Manufacturer; ComponentLink2 Description: Datasheet; NoPins: 08; Created Date: 23 August 2013; partNo: 662008231722; ComponentLink1URL: http://www.we-online.com; ComponentLink2URL: http://katalog.we-online.de/em/datasheet/6620xx231722.pdf; Created by: Karrer Zheng
footprint 662008231722 (Dual row SMT Right angle header With SMT Solder Tab 08p)
pins: 1, 2, 3, 4, 5, 6, 7, 8

## WE-3.00 mm Micro Power Connector 662010231722
designator C?
WR-MPC3 3.00 mm Male Dual Row SMT Angled Header with Solder Tab Clip; Manufacturer: Würth Elektronik eiSos GmbH; ComponentLink1 Description: Manufacturer; ComponentLink2 Description: Datasheet; NoPins: 10; Created Date: 23 August 2013; partNo: 662010231722; ComponentLink1URL: http://www.we-online.com; ComponentLink2URL: http://katalog.we-online.de/em/datasheet/6620xx231722.pdf; Created by: Karrer Zheng
footprint 662010231722 (Dual row SMT Right angle header With SMT Solder Tab 10p)
pins: 1, 2, 3, 4, 5, 6, 7, 8, 9, 10

## WE-3.00 mm Micro Power Connector 662012231722
designator C?
WR-MPC3 3.00 mm Male Dual Row SMT Angled Header with Solder Tab Clip; Manufacturer: Würth Elektronik eiSos GmbH; ComponentLink1 Description: Manufacturer; ComponentLink2 Description: Datasheet; NoPins: 12; Created Date: 23 August 2013; partNo: 662012231722; ComponentLink1URL: http://www.we-online.com; ComponentLink2URL: http://katalog.we-online.de/em/datasheet/6620xx231722.pdf; Created by: Karrer Zheng
footprint 662012231722 (Dual row SMT Right angle header With SMT Solder Tab 12p)
pins: 1, 2, 3, 4, 5, 6, 7, 8, 9, 10, 11, 12

## WE-3.00 mm Micro Power Connector 662014231722
designator C?
WR-MPC3 3.00 mm Male Dual Row SMT Angled Header with Solder Tab Clip; Manufacturer: Würth Elektronik eiSos GmbH; ComponentLink1 Description: Manufacturer; ComponentLink2 Description: Datasheet; NoPins: 14; Created Date: 23 August 2013; partNo: 662014231722; ComponentLink1URL: http://www.we-online.com; ComponentLink2URL: http://katalog.we-online.de/em/datasheet/6620xx231722.pdf; Created by: Karrer Zheng
footprint 662014231722 (Dual row SMT Right angle header With SMT Solder Tab 14p)
pins: 1, 2, 3, 4, 5, 6, 7, 8, 9, 10, 11, 12, 13, 14

## WE-3.00 mm Micro Power Connector 662016231722
designator C?
WR-MPC3 3.00 mm Male Dual Row SMT Angled Header with Solder Tab Clip; Manufacturer: Würth Elektronik eiSos GmbH; ComponentLink1 Description: Manufacturer; ComponentLink2 Description: Datasheet; NoPins: 16; Created Date: 23 August 2013; partNo: 662016231722; ComponentLink1URL: http://www.we-online.com; ComponentLink2URL: http://katalog.we-online.de/em/datasheet/6620xx231722.pdf; Created by: Karrer Zheng
footprint 662016231722 (Dual row SMT Right angle header With SMT Solder Tab 16p)
pins: 1, 2, 3, 4, 5, 6, 7, 8, 9, 10, 11, 12, 13, 14, 15, 16

## WE-3.00 mm Micro Power Connector 662018231722
designator C?
WR-MPC3 3.00 mm Male Dual Row SMT Angled Header with Solder Tab Clip; Manufacturer: Würth Elektronik eiSos GmbH; ComponentLink1 Description: Manufacturer; ComponentLink2 Description: Datasheet; NoPins: 18; Created Date: 23 August 2013; partNo: 662018231722; ComponentLink1URL: http://www.we-online.com; ComponentLink2URL: http://katalog.we-online.de/em/datasheet/6620xx231722.pdf; Created by: Karrer Zheng
footprint 662018231722 (Dual row SMT Right angle header With SMT Solder Tab 18p)
pins: 1, 2, 3, 4, 5, 6, 7, 8, 9, 10, 11, 12, 13, 14, 15, 16, 17, 18

## WE-3.00 mm Micro Power Connector 662020231722
designator C?
WR-MPC3 3.00 mm Male Dual Row SMT Angled Header with Solder Tab Clip; Manufacturer: Würth Elektronik eiSos GmbH; ComponentLink1 Description: Manufacturer; ComponentLink2 Description: Datasheet; NoPins: 20; Created Date: 23 August 2013; partNo: 662020231722; ComponentLink1URL: http://www.we-online.com; ComponentLink2URL: http://katalog.we-online.de/em/datasheet/6620xx231722.pdf; Created by: Karrer Zheng
footprint 662020231722 (Dual row SMT Right angle header With SMT Solder Tab 20p)
pins: 1, 2, 3, 4, 5, 6, 7, 8, 9, 10, 11, 12, 13, 14, 15, 16, 17, 18, 19, 20

## WE-3.00 mm Micro Power Connector 662022231722
designator C?
WR-MPC3 3.00 mm Male Dual Row SMT Angled Header with Solder Tab Clip; Manufacturer: Würth Elektronik eiSos GmbH; ComponentLink1 Description: Manufacturer; ComponentLink2 Description: Datasheet; NoPins: 22; Created Date: 23 August 2013; partNo: 662022231722; ComponentLink1URL: http://www.we-online.com; ComponentLink2URL: http://katalog.we-online.de/em/datasheet/6620xx231722.pdf; Created by: Karrer Zheng
footprint 662022231722 (Dual row SMT Right angle header With SMT Solder Tab 22p)
pins: 1, 2, 3, 4, 5, 6, 7, 8, 9, 10, 11, 12, 13, 14, 15, 16, 17, 18, 19, 20, 21, 22

## WE-3.00 mm Micro Power Connector 662024231722
designator C?
WR-MPC3 3.00 mm Male Dual Row SMT Angled Header with Solder Tab Clip; Manufacturer: Würth Elektronik eiSos GmbH; ComponentLink1 Description: Manufacturer; ComponentLink2 Description: Datasheet; NoPins: 24; Created Date: 23 August 2013; partNo: 662024231722; ComponentLink1URL: http://www.we-online.com; ComponentLink2URL: http://katalog.we-online.de/em/datasheet/6620xx231722.pdf; Created by: Karrer Zheng
footprint 662024231722 (Dual row SMT Right angle header With SMT Solder Tab 24p)
pins: 1, 2, 3, 4, 5, 6, 7, 8, 9, 10, 11, 12, 13, 14, 15, 16, 17, 18, 19, 20, 21, 22, 23, 24


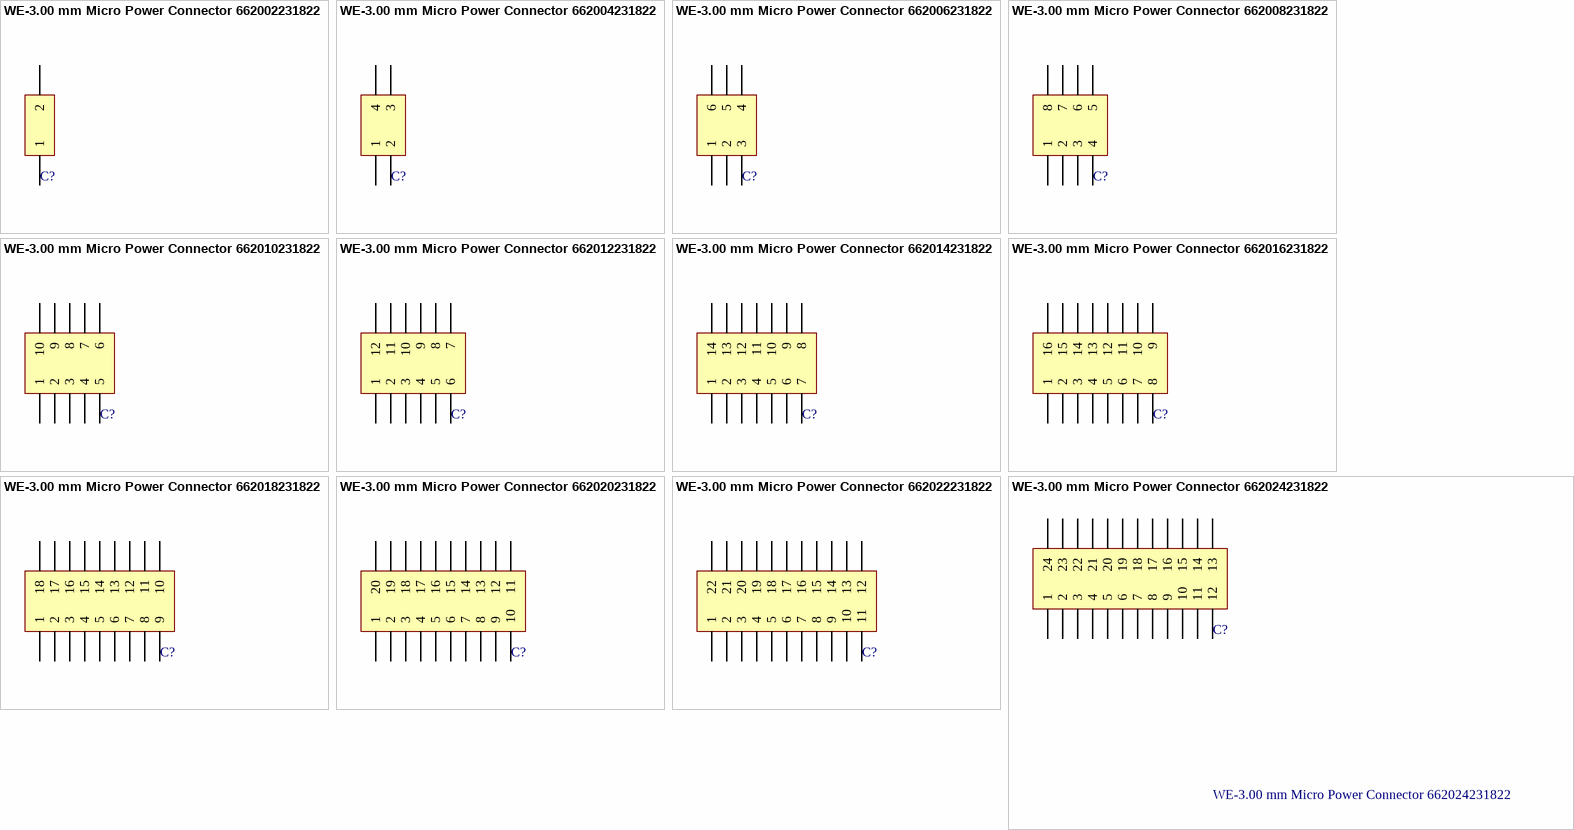
[diagram p13: symbols WE-3.00 mm Micro Power Connector 662002231822 to WE-3.00 mm Micro Power Connector 662024231822]